# Altium footprint library Connectors.PcbLib: 245 footprints (part 14 of 16)
Each footprint in its own frame and in the unit in brackets; x right, y up, seen from the top. Pads: shape width x height; smd on the part's side, far side on the other; paste and mask are expansions set on the pad; w line width, h text height; cw(c..) or ccw(c..) is an arc to the next point about the centre after c.
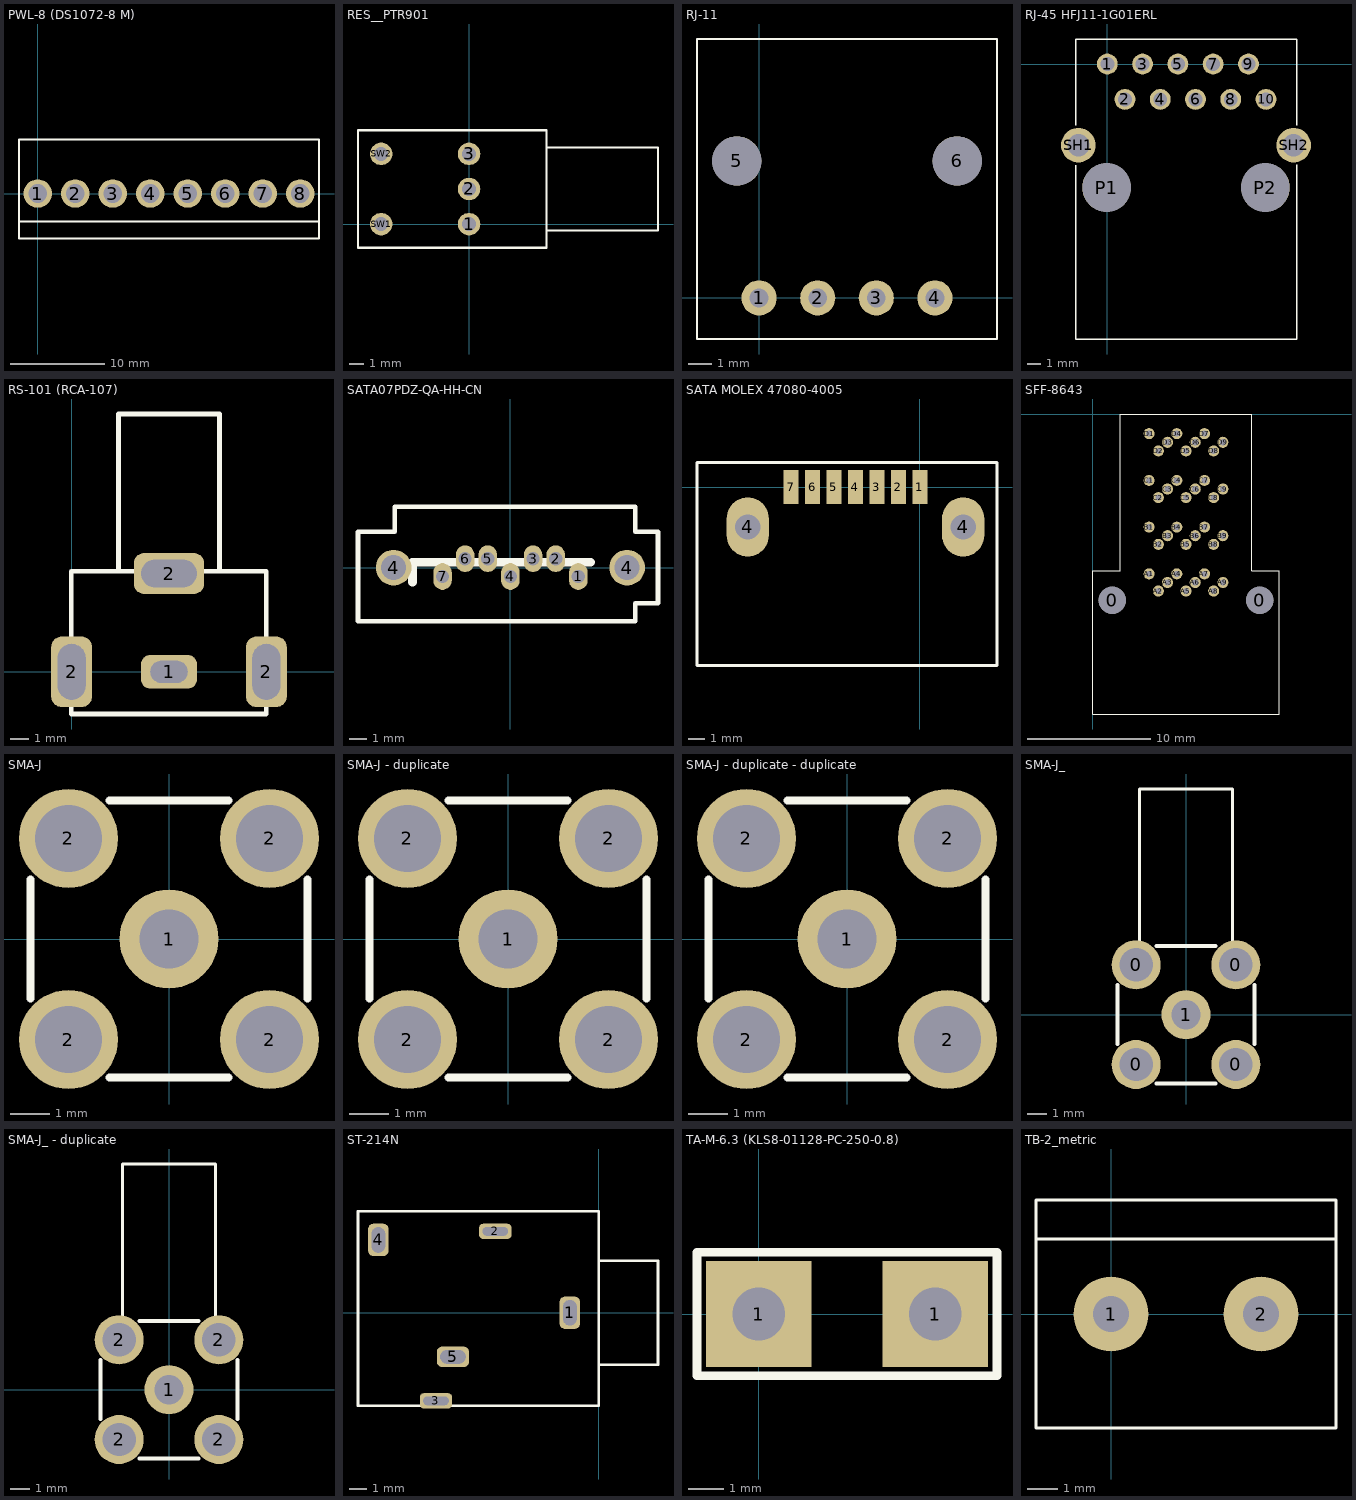
[diagram p13: the footprints below, top view; thin cyan lines are the x and y axes]

## PWL-8 (DS1072-8 M) [mm] "PHU-8 (DS1072-8 F) ответная часть"
pads (8):
  round 3 hole 2: 1(0,0) 2(3.96,0) 3(7.92,0) 4(11.88,0) 5(15.84,0) 6(19.8,0) 7(23.76,0) 8(27.72,0)
Top Overlay:
  lines w0.2: -1.96,-2.96 29.67,-2.96 ; 29.69,5.71 29.69,-4.75 -1.98,-4.75 -1.98,5.71 29.7,5.71
3D body "User Library-PWL-8.step": height 13.8, standoff -3.6, extent -1.97,-4.78 29.71,5.62

## RES__PTR901 [mm]
pads (5):
  round 1.6 hole 1: 1(0,0) 2(0,2.5) 3(0,5) SW1(-6.25,0) SW2(-6.25,5)
Top Overlay:
  lines w0.15: -7.9,-1.68 -6.25,-1.68 5.5,-1.68 5.5,2.49 5.5,6.68 -6.25,6.68 -7.9,6.68 -7.9,2.49 -7.9,-1.67 ; 5.51,-0.46 13.44,-0.46 13.44,5.46 5.51,5.46
3D body: height 8.98, standoff 3, extent 5.5,-0.504 13.5,5.484
3D body: height 11, standoff 0, extent -7.9,-1.68 5.5,6.68

## RJ-11 [mm]
pads (6):
  round 1.5 hole 0.8: 1(0,0) 2(2.5,0) 3(5,0) 4(7.5,0)
  round 2.1 hole 2.1 unplated: 5(-0.95,5.85) 6(8.45,5.85)
Top Overlay:
  lines w0.1: -2.65,-1.75 10.15,-1.75 10.15,11.05 -2.65,11.05 -2.65,-1.75
3D body "RJ-11.STEP": height 15.2, standoff -3, extent -2.8,-1.75 10.3,11.05

## RJ-45 HFJ11-1G01ERL [mm] "HALO RJ-45 Gigabit Ethernet FastJack"
height 15
pads (14):
  round 1.5 hole 1: 1(0,0) 2(1.27,-2.54) 3(2.54,0) 4(3.81,-2.54) 5(5.08,0) 6(6.35,-2.54) 7(7.62,0) 8(8.89,-2.54) 9(10.16,0) 10(11.43,-2.54)
  round 3.5 hole 3.5 unplated: P1(-0.05,-8.89) P2(11.38,-8.89)
  round 2.5 hole 1.6: SH1(-2.085,-5.84) SH2(13.415,-5.84)
Top Overlay:
  lines w0.1: -2.275,-7.295 -2.275,-19.785 -2.265,-19.795 13.625,-19.795 13.625,-7.245 ; -2.275,-4.395 -2.275,1.795 -2.265,1.805 13.625,1.805 13.625,-4.395
3D body "RJ-45.STEP": height 13.64, standoff -3.05, extent -2.275,-19.795 13.625,1.805

## RS-101 (RCA-107) [mm]
pads (4):
  rrect50% 3x1.8 hole 1.2 slot 2 at 0 deg: 1(5.25,0)
  rrect50% 2.2x3.8 hole 1.5 slot 3 at 90 deg: 2(0,0) 2(10.5,0)
  rrect50% 3.8x2.2 hole 1.5 slot 3 at 0 deg: 2(5.25,5.3)
Top Overlay:
  lines w0.254: 2.525,5.425 2.525,13.9 5.225,13.9 ; 5.275,13.9 7.975,13.9 7.975,5.425 ; -0.025,-2.275 10.5,-2.275 10.5,5.425 -0.025,5.425 -0.025,-2.275
3D body "RCJ-011-SMT.stp": height 11.5, standoff -1.7, extent -1.775,-0.975 12.225,14.075

## SATA07PDZ-QA-HH-CN [mm]
pads (9):
  oval 1.04x1.5 hole 0.74: 1(3.81,-0.5) 2(2.54,0.5) 3(1.27,0.5) 4(0,-0.5) 5(-1.27,0.5) 6(-2.54,0.5) 7(-3.81,-0.5)
  round 2 hole 1.4: 4(-6.55,0) 4(6.55,0)
Top Overlay:
  lines w0.254: -8.553,-3 7,-3 7,-2 8.282,-2 8.282,2 7,2 7,3.402 -6.5,3.402 -6.5,2 -8.553,2 -8.553,-3
  lines w0.5: -5.5,-0.8 -5.5,0.3 4.5,0.3
3D body "67800-8005.stp": height 8.7, standoff -2.35, extent -8.618,-2.943 8.282,3.507

## SATA MOLEX 47080-4005 [mm]
pads (9):
  rect 0.9x2 smd: 1(0,0) 2(-1.27,0) 3(-2.54,0) 4(-3.81,0) 5(-5.08,0) 6(-6.35,0) 7(-7.62,0)
  oval 2.5x3.5 hole 1.5: 4(-10.18,-2.36) 4(2.56,-2.36)
Top Overlay:
  lines w0.2: -13.18,-10.55 -13.18,1.45 4.56,1.45 4.56,-10.55 -13.18,-10.55
3D body "5607-4200-sh-02.stp": height 4.05, standoff -2.65, extent -12.88,-10.56 4.59,0.94

## SFF-8643 [mm]
pads (38):
  round 2.2 hole 2.2: 0(1.58,-15.15) 0(13.58,-15.15)
  round 0.9 hole 0.5: A1(4.58,-13) A2(5.33,-14.4) A3(6.08,-13.7) A4(6.83,-13) A5(7.58,-14.4) A6(8.33,-13.7) A7(9.08,-13) A8(9.83,-14.4) A9(10.58,-13.7) B1(4.58,-9.2) B2(5.33,-10.6) B3(6.08,-9.9) B4(6.83,-9.2) B5(7.58,-10.6) B6(8.33,-9.9) B7(9.08,-9.2) B8(9.83,-10.6) B9(10.58,-9.9) C1(4.58,-5.4) C2(5.33,-6.8) C3(6.08,-6.1) C4(6.83,-5.4) C5(7.58,-6.8) C6(8.33,-6.1) C7(9.08,-5.4) C8(9.83,-6.8) C9(10.58,-6.1) D1(4.58,-1.6) D2(5.33,-3) D3(6.08,-2.3) D4(6.83,-1.6) D5(7.58,-3) D6(8.33,-2.3) D7(9.08,-1.6) D8(9.83,-3) D9(10.58,-2.3)
Top Overlay:
  lines w0.1: 0,-24.4 15.16,-24.4 15.16,-12.75 12.91,-12.75 12.91,0 2.25,0 2.25,-12.75 0,-12.75 0,-24.4
3D body "s10112632.stp": height 13.95, standoff -1.33, extent 0,-24.4 15.16,0

## SMA-J [mm] "SMA coax. connector"
pads (5):
  round 2.5 hole 1.5: 1(0,0)
  round 2.5 hole 1.7: 2(-2.54,-2.54) 2(-2.54,2.54) 2(2.54,-2.54) 2(2.54,2.54)
Top Overlay:
  lines w0.2: -3.5,-1.5 -3.5,1.5 ; -1.5,-3.5 1.5,-3.5 ; -1.5,3.5 1.5,3.5 ; 3.5,-1.5 3.5,1.5
3D body "User Library-SMA_132134_Corrected.STEP": height 7.74, standoff -1, extent -3.185,-3.215 3.165,3.135

## SMA-J - duplicate [mm] "SMA coax. connector"
pads (5):
  round 2.5 hole 1.5: 1(0,0)
  round 2.5 hole 1.7: 2(-2.54,-2.54) 2(-2.54,2.54) 2(2.54,-2.54) 2(2.54,2.54)
Top Overlay:
  lines w0.2: -3.5,-1.5 -3.5,1.5 ; -1.5,-3.5 1.5,-3.5 ; -1.5,3.5 1.5,3.5 ; 3.5,-1.5 3.5,1.5
3D body "User Library-SMA_132134_Corrected.STEP": height 7.74, standoff -1, extent -3.185,-3.215 3.165,3.135
3D body "65503603230501.stp": height -2.75, standoff -19.7, extent -4.438,-22.198 4.599,3.802

## SMA-J - duplicate - duplicate [mm] "SMA coax. connector"
pads (5):
  round 2.5 hole 1.5: 1(0,0)
  round 2.5 hole 1.7: 2(-2.54,-2.54) 2(-2.54,2.54) 2(2.54,-2.54) 2(2.54,2.54)
Top Overlay:
  lines w0.2: -3.5,-1.5 -3.5,1.5 ; -1.5,-3.5 1.5,-3.5 ; -1.5,3.5 1.5,3.5 ; 3.5,-1.5 3.5,1.5
3D body "65503503515302.stp": height 31.75, standoff 2.8, extent -4.406,-4.414 4.406,4.414
3D body "User Library-SMA_132134_Corrected.STEP": height 7.74, standoff -1, extent -3.185,-3.215 3.165,3.135

## SMA-J_ [mm] "SMA coax. connector"
pads (5):
  round 2.5 hole 1.7: 0(-2.54,-2.54) 0(-2.54,2.54) 0(2.54,-2.54) 0(2.54,2.54)
  round 2.5 hole 1.5: 1(0,0)
Top Overlay:
  lines w0.15: -2.38,3.52 -2.38,11.5 0,11.5 2.38,11.5 2.38,3.48
  lines w0.2: -3.5,-1.5 -3.5,1.5 ; -1.5,-3.5 1.5,-3.5 ; -1.5,3.5 1.5,3.5 ; 3.5,-1.5 3.5,1.5
3D body "5-1814400-1.stp": height 10.18, standoff -3.66, extent -3.17,-3.15 3.17,11.05

## SMA-J_ - duplicate [mm] "SMA coax. connector"
pads (5):
  round 2.5 hole 1.5: 1(0,0)
  round 2.5 hole 1.7: 2(-2.54,-2.54) 2(-2.54,2.54) 2(2.54,-2.54) 2(2.54,2.54)
Top Overlay:
  lines w0.15: -2.38,3.52 -2.38,11.5 0,11.5 2.38,11.5 2.38,3.48
  lines w0.2: -3.5,-1.5 -3.5,1.5 ; -1.5,-3.5 1.5,-3.5 ; -1.5,3.5 1.5,3.5 ; 3.5,-1.5 3.5,1.5
3D body "65503603230501.stp": height -57.48, standoff -66.52, extent -3.635,66.267 13.315,92.267
3D body "5-1814400-1.stp": height 10.18, standoff -3.66, extent -3.17,-3.15 3.17,11.05

## ST-214N [mm]
pads (5):
  rrect50% 1.2x1.9 hole 0.8 slot 1.5 at 90 deg unplated: 1(-1.7,0) 4(-13,4.3)
  rrect50% 1.9x0.9 hole 0.5 slot 1.5 at 0 deg unplated: 2(-6.1,4.8) 3(-9.6,-5.2)
  rrect50% 1.9x1.2 hole 0.8 slot 1.5 at 0 deg unplated: 5(-8.6,-2.6)
Top Overlay:
  lines w0.15: 0,-3.075 3.5,-3.075 3.5,3.075 0,3.075 ; -14.2,-5.5 -14.2,6 0,6 0,-5.5 -14.2,-5.5
Bottom Overlay:
  text "3" at -10.9,-5.8 h2
  text "5" at -8.35,-1.7 h2
  text "4" at -12.65,1.75 h2
  text "1" at -2.65,-0.6 h2
  text "2" at -5.75,2.7 h2
3D body: height 6, standoff 0, extent -0.01,-2.95 3.49,3.05
3D body: height 6.2, standoff 0, extent -14.2,-5.5 0,6

## TA-M-6.3 (KLS8-01128-PC-250-0.8) [mm] "Клемма ножевая 6,3мм"
pads (2):
  rect 3x3 hole 1.5: 1(0,0) 1(5,0)
Top Overlay:
  lines w0.254: -1.75,-1.75 -1.75,1.75 6.75,1.75 6.75,-1.75 -1.75,-1.75
3D body "TA-M-6.3.step": height 10, standoff -3.5, extent -1.5,-0.4 6.5,0.4

## TB-2_metric [mm] "Terminal block TB-2 metric (h=5.0mm)"
height 10.1
pads (2):
  round 2.5 hole 1.2: 1(0,0) 2(5,0)
Top Overlay:
  lines w0.1: -2.5,2.5 7.5,2.5 ; -2.5,-3.8 -2.5,3.8 7.5,3.8 7.5,-3.8 -2.5,-3.8
3D body "TB-2_metric214.STEP": height 10.1, standoff -4, extent -2.494,-3.787 7.506,3.813